# Altium footprint library NUCLEOG431RB-Custom-IN-A2212.PcbLib: 80 footprints (part 3 of 5)
Each footprint in its own frame and in the unit in brackets; x right, y up, seen from the top. Pads: shape width x height; smd on the part's side, far side on the other; paste and mask are expansions set on the pad; w line width, h text height; cw(c..) or ccw(c..) is an arc to the next point about the centre after c.
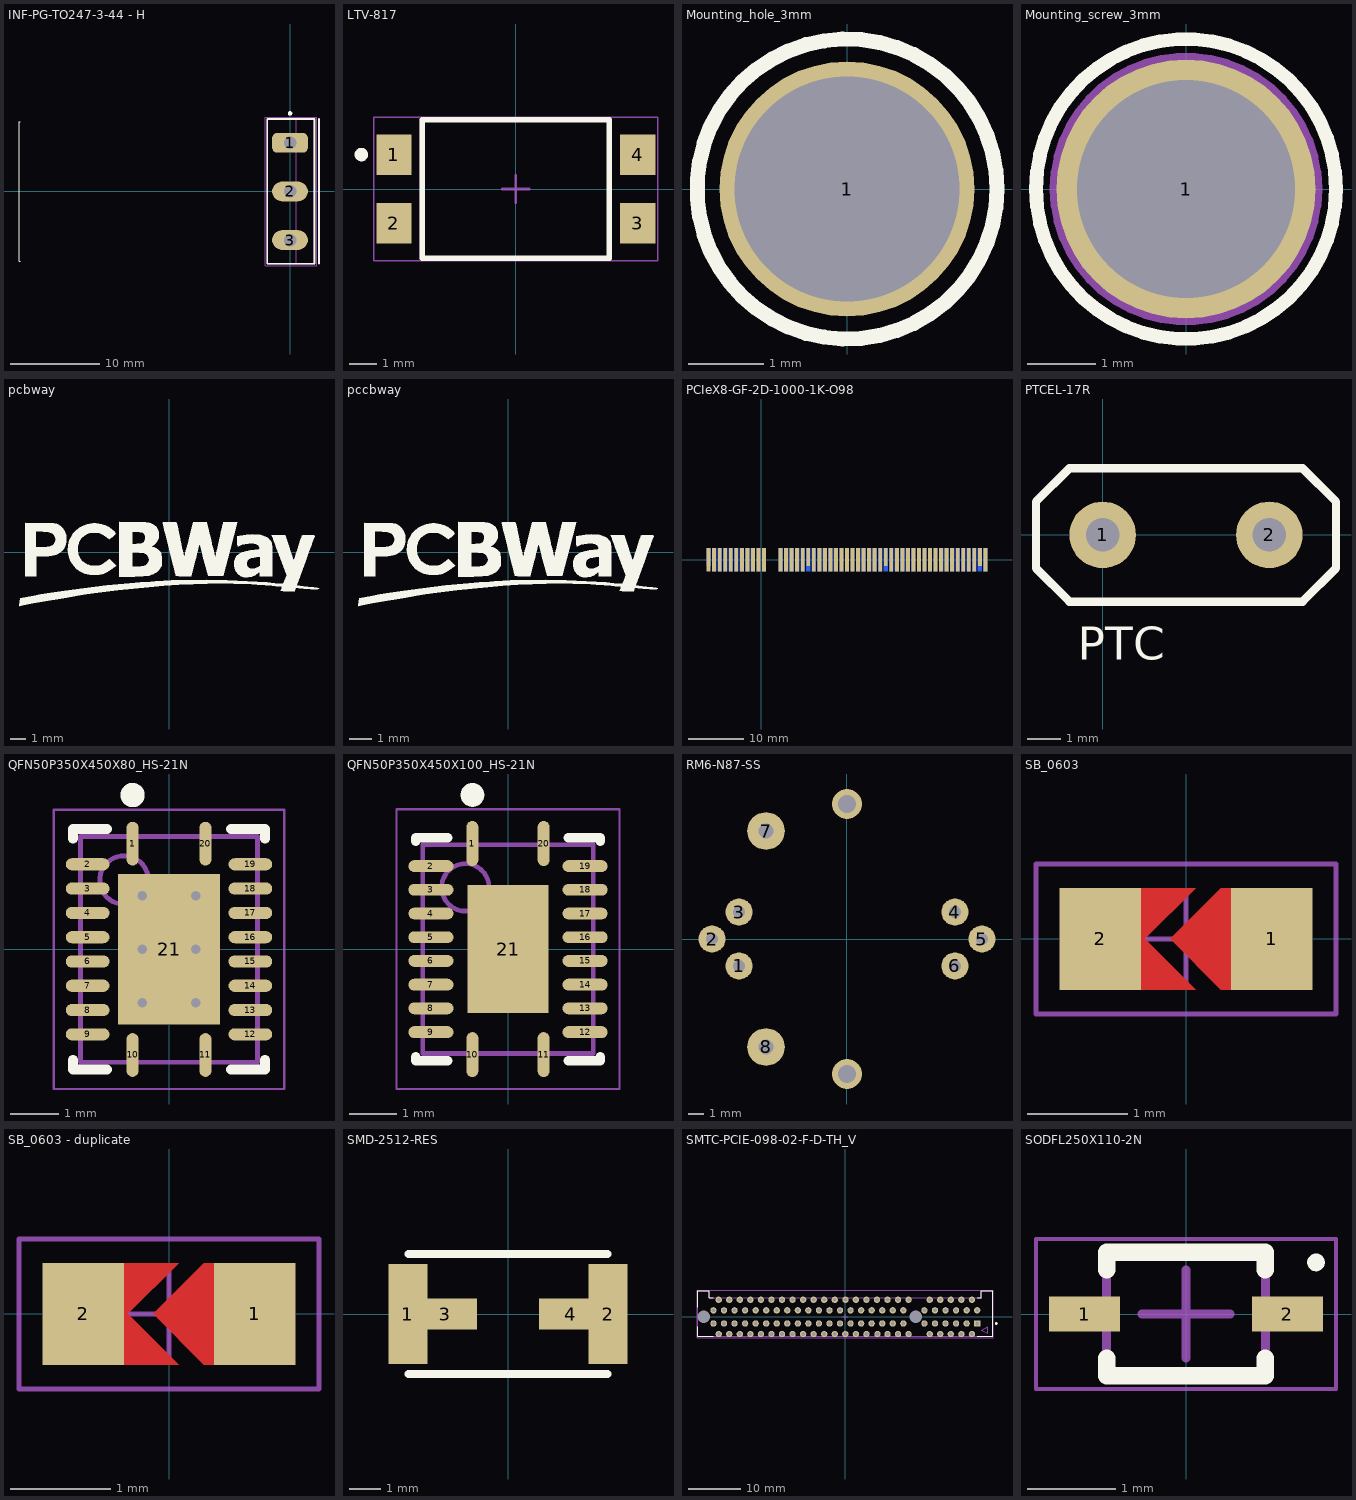
[diagram p2: the footprints below, top view; thin cyan lines are the x and y axes]

## INF-PG-TO247-3-44 - H [mm] "FM, 3-Leads, Body 5.02x15.94mm, Pitch 5.44mm"
height 25.5
pads (3):
  rrect50% 4x2.2 hole 1.4: 1(0,5.44)
  oval 4x2.2 hole 1.4: 2(0,0) 3(0,-5.44)
Top Overlay:
  circle w0.25: c0,8.75 r0.125
  lines w0.05: -30.2,-7.8 -30.35,-7.8 -30.35,7.8 -30.2,7.8
  lines w0.2: 3.245,-8.1 3.245,8.1 ; -2.555,-8.1 2.745,-8.1 2.745,8.1 -2.555,8.1 -2.555,-8.1
Mechanical 13:
  lines w0.1: 0.67,-8.075 0.67,8.075 ; -2.53,-8.075 -2.53,8.075 2.72,8.075 2.72,-8.075 -2.53,-8.075
Mechanical 15:
  lines w0.05: -2.78,-8.325 -2.78,8.325 2.97,8.325 2.97,-8.325 -2.78,-8.325
  lines w0.1: -0.5,0 0.5,0 ; 0,-0.5 0,0.5
3D body "TO-247_horizontal_back_line.stp": height 5.01, standoff -3.59, extent -30.346,-7.8 0.254,7.8

## LTV-817 [mm]
pads (4):
  rect 1.3x1.5 smd: 1(-4.5,1.27) 2(-4.5,-1.27) 3(4.5,-1.27) 4(4.5,1.27)
Top Overlay:
  circle w0.25: c-5.7,1.27 r0.125
  lines w0.2: -3.45,-2.55 -3.45,2.55 3.45,2.55 3.45,-2.55 -3.45,-2.55
Mechanical 13:
  lines w0.1: -3.5,-2.55 -3.5,2.55 3.5,2.55 3.5,-2.55 -3.5,-2.55
Mechanical 15:
  lines w0.05: -5.25,-2.65 -5.25,2.65 5.25,2.65 5.25,-2.65 -5.25,-2.65
  lines w0.1: -0.5,0 0.5,0 ; 0,-0.5 0,0.5
3D body "DIP-4_W7.62mm_SMDSocket.step": height 3.68, standoff 0, extent -4.476,-2.6 4.476,2.6

## Mounting_hole_3mm [mm]
pads (1):
  round 3.4 hole 3: 1(0,0)
Top Overlay:
  circle w0.2: c0,0 r2

## Mounting_screw_3mm [mm]
pads (1):
  round 3.8 hole 3.2: 1(0,0)
Top Overlay:
  circle w0.2: c0,0 r2.2
Mechanical 1:
  circle w0.2: c0,0 r1.9
3D body "4mm_screw.x_t": height 3.13, standoff -4.87, extent -2.766,-2.732 2.734,2.768

## pcbway [mm]
Top Overlay:
  drawing of 6 lines, arcs and shapes, not listed

## pccbway [mm]
Top Overlay:
  drawing of 6 lines, arcs and shapes, not listed

## PCIeX8-GF-2D-1000-1K-O98 [mm] "Golden finger, PCIeX8, Dual, Opposite, Pitch 1mm, 98-Position"
pads (98):
  rect 0.7x3.2 smd far side: A1(-9.5,0.5)
  rect 0.7x4.2 smd far side: A2(-8.5,0) A3(-7.5,0) A4(-6.5,0) A5(-5.5,0) A6(-4.5,0) A7(-3.5,0) A8(-2.5,0) A9(-1.5,0) A10(-0.5,0) A11(0.5,0) A12(3.5,0) A13(4.5,0) A14(5.5,0) A15(6.5,0) A16(7.5,0) A17(8.5,0) A18(9.5,0) A19(10.5,0) A20(11.5,0) A21(12.5,0) A22(13.5,0) A23(14.5,0) A24(15.5,0) A25(16.5,0) A26(17.5,0) A27(18.5,0) A28(19.5,0) A29(20.5,0) A30(21.5,0) A31(22.5,0) A32(23.5,0) A33(24.5,0) A34(25.5,0) A35(26.5,0) A36(27.5,0) A37(28.5,0) A38(29.5,0) A39(30.5,0) A40(31.5,0) A41(32.5,0) A42(33.5,0) A43(34.5,0) A44(35.5,0) A45(36.5,0) A46(37.5,0) A47(38.5,0) A48(39.5,0) A49(40.5,0)
  rect 0.7x4.2 smd: B1(-9.5,0) B2(-8.5,0) B3(-7.5,0) B4(-6.5,0) B5(-5.5,0) B6(-4.5,0) B7(-3.5,0) B8(-2.5,0) B9(-1.5,0) B10(-0.5,0) B11(0.5,0) B12(3.5,0) B13(4.5,0) B14(5.5,0) B15(6.5,0) B16(7.5,0) B18(9.5,0) B19(10.5,0) B20(11.5,0) B21(12.5,0) B22(13.5,0) B23(14.5,0) B24(15.5,0) B25(16.5,0) B26(17.5,0) B27(18.5,0) B28(19.5,0) B29(20.5,0) B30(21.5,0) B32(23.5,0) B33(24.5,0) B34(25.5,0) B35(26.5,0) B36(27.5,0) B37(28.5,0) B38(29.5,0) B39(30.5,0) B40(31.5,0) B41(32.5,0) B42(33.5,0) B43(34.5,0) B44(35.5,0) B45(36.5,0) B46(37.5,0) B47(38.5,0) B49(40.5,0)
  rect 0.7x3.2 smd: B17(8.5,0.5) B31(22.5,0.5) B48(39.5,0.5)
Top Solder:
  rectangle: -10.4,-3.75 41.4,2.225
Bottom Solder:
  rectangle: -10.4,-3.75 41.4,2.225

## PTCEL-17R [mm]
pads (2):
  round 2 hole 1: 1(0,0) 2(5,0)
Top Overlay:
  lines w0.254: -2,-1 -2,1 -1,2 6,2 7,1 7,-1 6,-2 -1,-2 -2,-1
  text "PTC" at -0.746,-3.746 h1
3D body "PTCEL17R.x_t": height 23.5, standoff -20, extent -5.25,-3.5 10.25,3.5

## QFN50P350X450X80_HS-21N [mm] "QFN, 20-Leads, Body 3.50x4.50mm, Pitch 1.50mm/0.50mm, Thermal Pad 2.10x3.10mm, IPC Medium Density"
height 0.8
pads (21):
  oval 0.25x0.9 smd mask+0.152: 1(-0.75,2.175) 10(-0.75,-2.175) 11(0.75,-2.175) 20(0.75,2.175)
  oval 0.9x0.25 smd mask+0.152: 2(-1.675,1.75) 3(-1.675,1.25) 4(-1.675,0.75) 5(-1.675,0.25) 6(-1.675,-0.25) 7(-1.675,-0.75) 8(-1.675,-1.25) 9(-1.675,-1.75) 12(1.675,-1.75) 13(1.675,-1.25) 14(1.675,-0.75) 15(1.675,-0.25) 16(1.675,0.25) 17(1.675,0.75) 18(1.675,1.25) 19(1.675,1.75)
  rect 2.1x3.1 smd mask+0.457: 21(0,0)
via 0.55,-1.1 diameter 0.5 hole 0.2
via -0.55,-1.1 diameter 0.5 hole 0.2
via 0.55,0 diameter 0.5 hole 0.2
via -0.55,0 diameter 0.5 hole 0.2
via 0.55,1.1 diameter 0.5 hole 0.2
via -0.55,1.1 diameter 0.5 hole 0.2
Top Overlay:
  circle w0.25: c-0.75,3.175 r0.125
  lines w0.2: -1.975,-2.275 -1.975,-2.475 -1.275,-2.475 ; -1.975,2.275 -1.975,2.475 -1.275,2.475 ; 1.275,-2.475 1.975,-2.475 1.975,-2.275 ; 1.275,2.475 1.975,2.475 1.975,2.275
Mechanical 13:
  circle w0.1: c-0.925,1.425 r0.5
  lines w0.1: -1.825,-2.325 1.825,-2.325 1.825,2.325 -1.825,2.325 -1.825,-2.325
Mechanical 15:
  lines w0.05: -2.375,-2.875 2.375,-2.875 2.375,2.875 -2.375,2.875 -2.375,-2.875
  lines w0.1: -0.5,0 0.5,0 ; 0,-0.5 0,0.5
3D body "QFN50P350X450X80_HS-21N.step": height 0.8, standoff 0, extent -1.875,-2.375 1.875,2.375

## QFN50P350X450X100_HS-21N [mm] "QFN, 20-Leads, Body 3.50x4.50mm, Pitch 1.50mm/0.50mm, Thermal Pad 1.70x2.70mm, IPC Medium Density"
height 1
pads (21):
  oval 0.25x0.95 smd mask+0.152: 1(-0.75,2.225) 10(-0.75,-2.225) 11(0.75,-2.225) 20(0.75,2.225)
  oval 0.95x0.25 smd mask+0.152: 2(-1.625,1.75) 3(-1.625,1.25) 4(-1.625,0.75) 5(-1.625,0.25) 6(-1.625,-0.25) 7(-1.625,-0.75) 8(-1.625,-1.25) 9(-1.625,-1.75) 12(1.625,-1.75) 13(1.625,-1.25) 14(1.625,-0.75) 15(1.625,-0.25) 16(1.625,0.25) 17(1.625,0.75) 18(1.625,1.25) 19(1.625,1.75)
  rect 1.7x2.7 smd mask+0.61: 21(0,0)
Top Overlay:
  circle w0.25: c-0.75,3.25 r0.125
  lines w0.2: -1.95,-2.275 -1.95,-2.35 -1.275,-2.35 ; -1.95,2.275 -1.95,2.35 -1.275,2.35 ; 1.275,-2.35 1.95,-2.35 1.95,-2.275 ; 1.275,2.35 1.95,2.35 1.95,2.275
Mechanical 13:
  circle w0.1: c-0.9,1.3 r0.5
  lines w0.1: -1.8,-2.2 1.8,-2.2 1.8,2.2 -1.8,2.2 -1.8,-2.2
Mechanical 15:
  lines w0.05: -2.35,-2.95 2.35,-2.95 2.35,2.95 -2.35,2.95 -2.35,-2.95
  lines w0.1: -0.5,0 0.5,0 ; 0,-0.5 0,0.5
3D body "QFN50P350X450X100_HS-21N.step": height 1, standoff 0, extent -1.85,-2.25 1.85,2.25

## RM6-N87-SS [mm] "TDK"
pads (10):
  round 1.8 hole 0.8: 1(-7.184,-1.796) 2(-8.98,0) 3(-7.184,1.796) 4(7.184,1.796) 5(8.98,0) 6(7.184,-1.796)
  round 2.5 hole 1: 7(-5.388,7.184) 8(-5.388,-7.184)
  round 2 hole 1.2: ""(0,-8.98) ""(0,8.98)
3D body "RM6-K-6P-DS.STEP": height 13.2, standoff -1.7, extent -10.08,-8.95 10.12,8.95

## SB_0603 [mil] "Jumper"
height 39.37
pads (2):
  rect 32x40 smd: 1(33.75,0) 2(-33.75,0)
Top Layer:
  region: -26.25,0 -16.25,0 3.75,-20 -26.25,-20
  region: -26.25,0 -16.25,0 3.75,20 -26.25,20
  region: 23.75,20 13.75,20 -6.25,0 13.75,-20 23.75,-20
Top Paste:
  region: 23.75,20 13.75,20 -6.25,0 13.75,-20 23.75,-20
Top Solder:
  region: -53.75,23.99 -53.74,24.01 53.75,24.01 53.75,-24.01 53.72,-24.04 -53.72,-24.04 -53.73,-24.05
Mechanical 15:
  lines w1.97: -18.7,0 18.7,0 ; 0,-18.7 0,18.7 ; -59.06,-29.53 -59.06,29.53 59.06,29.53 59.06,-29.53 -59.06,-29.53

## SB_0603 - duplicate [mil] "Jumper"
height 39.37
pads (2):
  rect 32x40 smd: 1(33.75,0) 2(-33.75,0)
Top Layer:
  region: -26.25,0 -16.25,0 3.75,-20 -26.25,-20
  region: -26.25,0 -16.25,0 3.75,20 -26.25,20
  region: 23.75,20 13.75,20 -6.25,0 13.75,-20 23.75,-20
Top Paste:
  region: -26.25,0 -16.25,0 3.75,-20 -26.25,-20
  region: -26.25,0 -16.25,0 3.75,20 -26.25,20
  region: 23.75,20 13.75,20 -6.25,0 13.75,-20 23.75,-20
Top Solder:
  region: -26.25,0 -12.25,0 11.75,-24 -26.25,-24
  region: -26.25,0 -12.25,0 11.75,24 -26.25,24
  region: 23.75,24 13.75,24 -10.25,0 13.75,-24 23.75,-24
Mechanical 15:
  lines w1.97: -18.7,0 18.7,0 ; 0,-18.7 0,18.7 ; -59.06,-29.53 59.06,-29.53 59.06,29.53 -59.06,29.53 -59.06,-29.53

## SMD-2512-RES [mil]
pads (4):
  rect 49x125 smd: 1(-125.5,0) 2(125.5,0)
  rect 80x39.37 smd: 3(-78.74,0) 4(78.74,0)
Top Overlay:
  lines w10: -125,-75 125,-75 ; -125,75 125,75
3D body "resistor 2512.step": height 63.07, standoff 0, extent -124.99,-59.05 125,59.06

## SMTC-PCIE-098-02-F-D-TH_V [mm] "TH, 98-Leads, Body 56x8.61mm, Pitch 1mm"
height 11
pads (100):
  rect 1.2x1.2 hole 0.7: A1(25.017,-1.25)
  round 1.2 hole 0.7: A2(24.017,-3.25) A3(23.017,-1.25) A4(22.017,-3.25) A5(21.017,-1.25) A6(20.017,-3.25) A7(19.017,-1.25) A8(18.017,-3.25) A9(17.017,-1.25) A10(16.017,-3.25) A11(15.017,-1.25) A12(12.017,-3.25) A13(11.017,-1.25) A14(10.017,-3.25) A15(9.017,-1.25) A16(8.017,-3.25) A17(7.017,-1.25) A18(6.107,-3.25) A19(5.017,-1.25) A20(4.017,-3.25) A21(3.017,-1.25) A22(2.017,-3.25) A23(1.017,-1.25) A24(0.017,-3.25) A25(-0.983,-1.25) A26(-1.983,-3.25) A27(-2.983,-1.25) A28(-3.983,-3.25) A29(-4.983,-1.25) A30(-5.983,-3.25) A31(-6.983,-1.25) A32(-7.983,-3.25) A33(-8.983,-1.25) A34(-9.983,-3.25) A35(-10.983,-1.25) A36(-11.983,-3.25) A37(-12.983,-1.25) A38(-13.983,-3.25) A39(-14.983,-1.25) A40(-15.983,-3.25) A41(-16.983,-1.25) A42(-17.983,-3.25) A43(-18.983,-1.25) A44(-19.983,-3.25) A45(-20.983,-1.25) A46(-21.983,-3.25) A47(-22.983,-1.25) A48(-23.983,-3.25) A49(-24.983,-1.25) B1(25.017,1.25) B2(24.017,3.25) B3(23.017,1.25) B4(22.017,3.25) B5(21.017,1.25) B6(20.017,3.25) B7(19.017,1.25) B8(18.017,3.25) B9(17.017,1.25) B10(16.017,3.25) B11(15.017,1.25) B12(12.017,3.25) B13(11.017,1.25) B14(10.017,3.25) B15(9.017,1.25) B16(8.017,3.25) B17(7.017,1.25) B18(6.017,3.25) B19(5.017,1.25) B20(4.017,3.25) B21(3.017,1.25) B22(2.017,3.25) B23(1.017,1.25) B24(0.051,3.25) B25(-0.983,1.25) B26(-1.983,3.25) B27(-2.983,1.25) B28(-3.983,3.25) B29(-4.983,1.25) B30(-5.983,3.25) B31(-6.983,1.25) B32(-7.983,3.25) B33(-8.983,1.25) B34(-9.983,3.25) B35(-10.983,1.25) B36(-11.983,3.25) B37(-12.983,1.25) B38(-13.983,3.25) B39(-14.983,1.25) B40(-15.983,3.25) B41(-16.983,1.25) B42(-17.983,3.25) B43(-18.983,1.25) B44(-19.983,3.25) B45(-20.983,1.25) B46(-21.983,3.25) B47(-22.983,1.25) B48(-23.983,3.25) B49(-24.983,1.25)
  round 0 hole 2.35 unplated: MH1(13.367,0) MH2(-26.793,0)
Top Overlay:
  circle w0.25: c28.65,-1.25 r0.125
  lines w0.2: -28,-1.825 -28,-3.65 -24.983,-3.65 ; -28,1.825 -28,4.96 -25.765,4.96 -25.765,3.65 -24.983,3.65 ; 25.017,-3.65 28,-3.65 28,4.96 25.765,4.96 25.765,3.65 25.017,3.65
Mechanical 13:
  lines w0.1: -28,-3.65 -28,4.96 -25.765,4.96 -25.765,3.65 25.765,3.65 25.765,4.96 28,4.96 28,-3.65 -28,-3.65 ; 25.881,-2.502 26.981,-1.867 26.981,-3.137 25.881,-2.502
Mechanical 15:
  lines w0.05: -28.1,-3.95 -28.1,5.06 28.1,5.06 28.1,-3.95 -28.1,-3.95
  lines w0.1: -0.5,0 0.5,0 ; 0,-0.5 0,0.5
3D body "PCIE-098-02-F-D-TH.stp": height 11.01, standoff -4.4, extent -28,-3.65 28,5.05

## SODFL250X110-2N [mm] "SODFL, 2-Leads, Body 1.30x2.50mm, IPC Medium Density"
height 1.1
pads (2):
  rect 0.8x0.4 smd: 1(-1.15,0) 2(1.15,0)
Top Overlay:
  circle w0.1: c1.473,0.584 r0.05
  lines w0.2: -0.9,-0.5 -0.9,-0.7 0.9,-0.7 0.9,-0.5 ; -0.9,0.5 -0.9,0.7 0.9,0.7 0.9,0.5
Mechanical 13:
  lines w0.1: -0.9,-0.7 0.9,-0.7 0.9,0.7 -0.9,0.7 -0.9,-0.7
Mechanical 15:
  lines w0.05: -1.7,-0.85 1.7,-0.85 1.7,0.85 -1.7,0.85 -1.7,-0.85
  lines w0.1: -0.5,0 0.5,0 ; 0,-0.5 0,0.5
3D body "SODFL250X110-2N.step": height 1.1, standoff 0, extent -1.25,-0.7 1.25,0.7